# Altium footprint library mainLib.PcbLib: 169 footprints (part 5 of 11)
Each footprint in its own frame and in the unit in brackets; x right, y up, seen from the top. Pads: shape width x height; smd on the part's side, far side on the other; paste and mask are expansions set on the pad; w line width, h text height; cw(c..) or ccw(c..) is an arc to the next point about the centre after c.
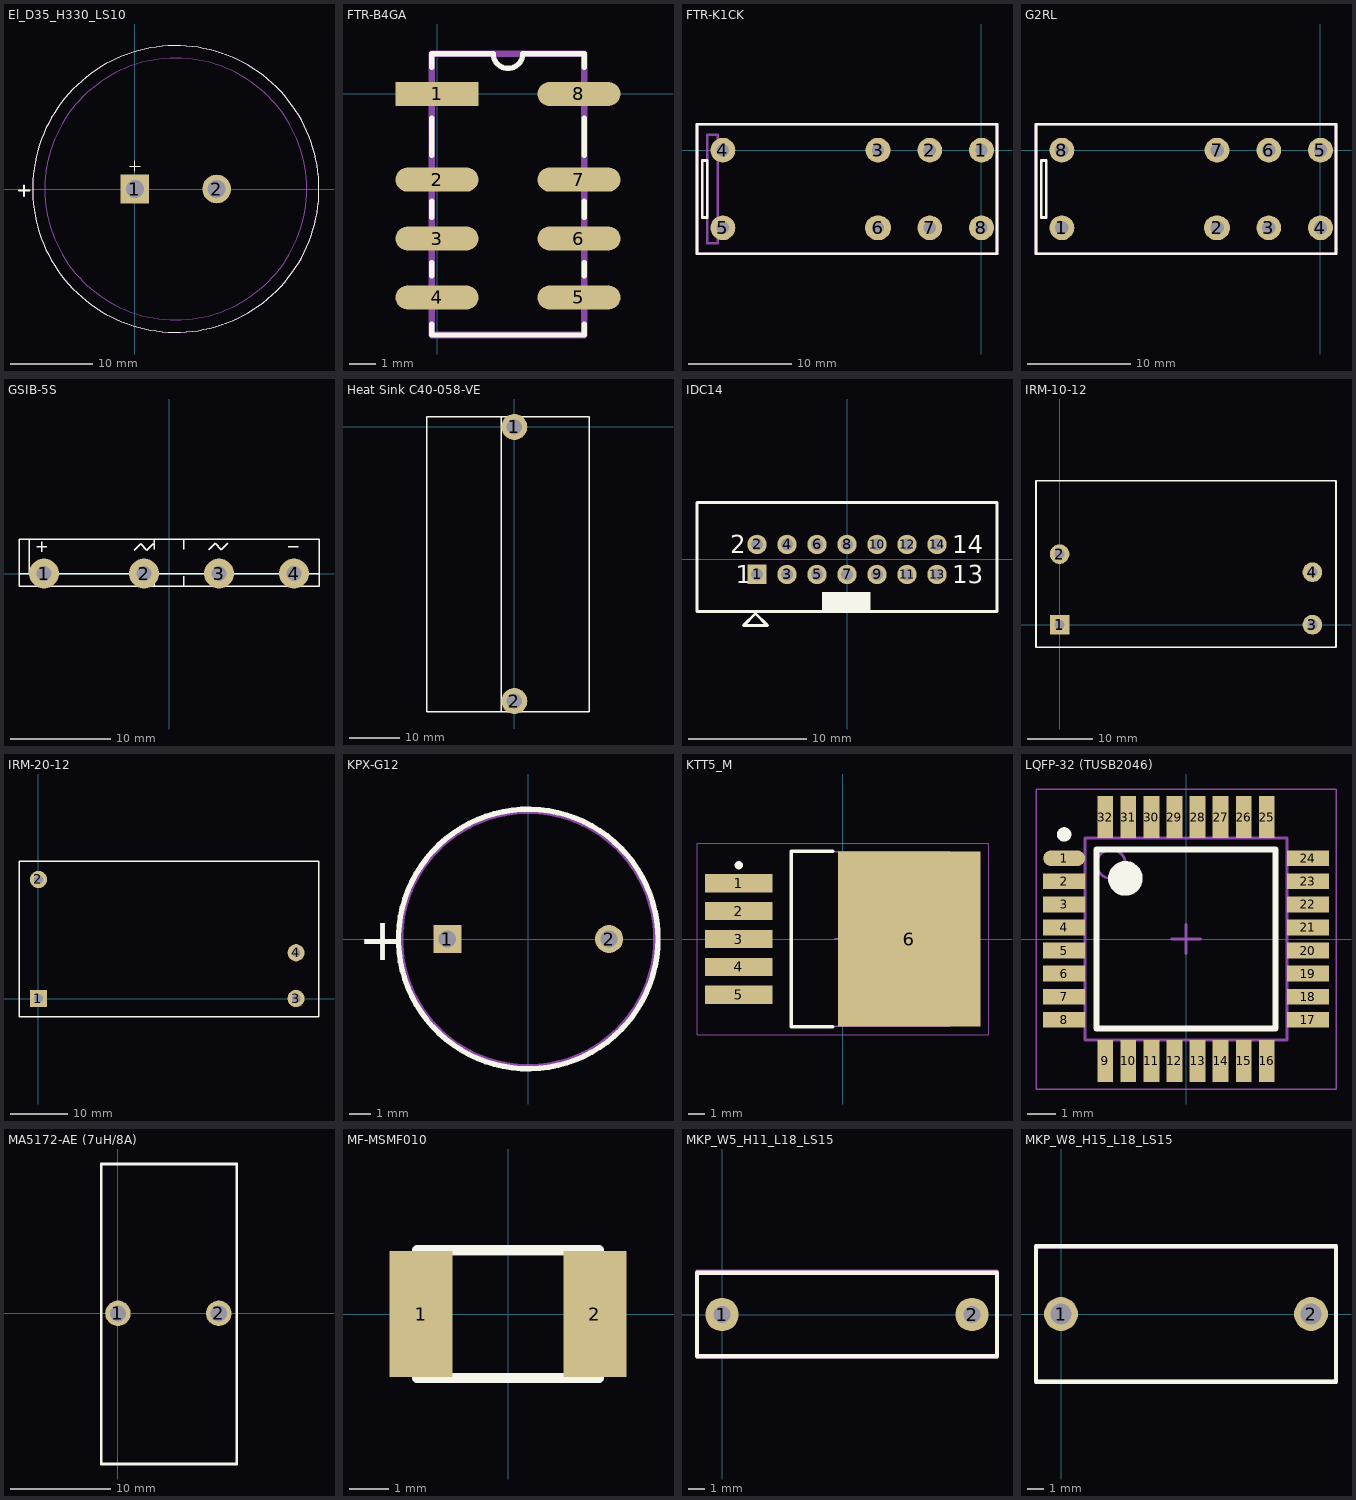
[diagram p4: the footprints below, top view; thin cyan lines are the x and y axes]

## El_D35_H330_LS10 [mm]
pads (2):
  rect 3.5x3.5 hole 2.2: 1(0,0)
  round 3.5 hole 2.2 mask+0.102: 2(10,0)
Top Overlay:
  circle w0.127: c5,0 r17.5
  lines w0.127: -0.635,2.803 0.635,2.803 ; 0,2.168 0,3.438
  lines w0.254: -14.15,-0.175 -12.9,-0.175 ; -13.525,-0.825 -13.525,0.425
Mechanical 13:
  circle w0.127: c5,0 r17.5
  circle w0.127: c5,0 r16
  circle w0.127: c5,0 r17.5
3D body: height 3, standoff 0, extent -12.499,-17.499 22.499,17.499
3D body: height 30, standoff 5, extent -12.499,-17.499 22.499,17.499
3D body: height 5, standoff 3, extent -10.999,-15.999 20.999,15.999

## FTR-B4GA [mm] "FTR-B4GA"
height 9.7
pads (8):
  rect 3.1x0.9 smd: 1(0,0)
  oval 3.1x0.9 smd: 2(0,-3.2) 3(0,-5.4) 4(0,-7.6) 5(5.3,-7.6) 6(5.3,-5.4) 7(5.3,-3.2) 8(5.3,0)
Top Overlay:
  lines w0.2: -0.2,-8.6 -0.2,-9 5.5,-9 5.5,-8.6 ; -0.2,-6.8 -0.2,-6.3 ; -0.2,-4.6 -0.2,-4 ; -0.2,-2.3 -0.2,-0.9 ; -0.2,1 -0.2,1.5 2.1,1.5 ccw(c2.65,1.5) 3.2,1.5 5.5,1.5 5.5,1 ; 5.5,-6.8 5.5,-6.3 ; 5.5,-4.6 5.5,-4 ; 5.5,-2.3 5.5,-0.9
Mechanical 13:
  lines w0.254: -0.2,-9 -0.2,1.5 5.5,1.5 5.5,-9 -0.2,-9
3D body: height 9.7, standoff 0, extent -0.199,-8.999 5.499,1.499

## FTR-K1CK [mm]
pads (8):
  round 2.4 hole 1.2: 1(0,0) 2(-5,0) 3(-10,0) 4(-25,0) 5(-25,-7.5) 7(-5,-7.5) 8(0,-7.5)
  oval 2.5x2.4 hole 1.2: 6(-10,-7.5)
Top Overlay:
  lines w0.254: -27.5,-10 1.5,-10 1.5,2.5 -27.5,2.5 -27.5,-10 ; -27,-6.5 -27,-1 -26.5,-1 -26.5,-6.5 -27,-6.5
Mechanical 13:
  lines w0.254: -27.5,-10 1.5,-10 1.5,2.5 -27.5,2.5 -27.5,-10 ; -26.5,-9 -25.5,-9 -25.5,1.5 -26.5,1.5 -26.5,-9
3D body: height 15.6, standoff 0, extent -27.499,-9.999 1.499,2.499
3D body: height 15.7, standoff 15.6, extent -26.499,-8.999 -25.501,1.499

## G2RL [mm]
pads (8):
  round 2.4 hole 1.3: 1(-25,-7.5) 3(-5,-7.5) 4(0,-7.5) 5(0,0) 6(-5,0) 7(-10,0) 8(-25,0)
  oval 2.5x2.4 hole 1.3: 2(-10,-7.5)
Top Overlay:
  lines w0.254: -27.5,-10 -27.5,2.5 1.5,2.5 1.5,-10 -27.5,-10 ; -27,-6.5 -26.5,-6.5 -26.5,-1 -27,-1 -27,-6.5
Mechanical 13:
  lines w0.254: -27.5,-10 -27.5,2.5 1.5,2.5 1.5,-10 -27.5,-10
3D body: height 15.7, standoff 15.6, extent -26.499,-8.999 -25.501,1.499
3D body: height 15.6, standoff 0, extent -27.499,-9.999 1.499,2.499

## GSIB-5S [mm]
pads (4):
  round 3 hole 1.5: 1(-12.5,0) 2(-2.5,0) 3(5,0) 4(12.5,0)
Top Overlay:
  lines w0.127: -15,0 15,0 ; -14,0 -14,3.4 ; -13.2,2.667 -12.2,2.667 ; -12.7,2.167 -12.7,3.167 ; -3.484,2.341 -2.849,2.976 -2.214,2.341 -1.579,2.976 ; -1.5,-1.27 -1.5,-0.27 ; -1.5,2.4 -1.5,3.4 ; 1.5,-1.27 1.5,-0.27 ; 1.5,2.4 1.5,3.4 ; 3.969,2.388 4.604,3.023 5.239,2.388 5.874,3.023 ; 11.946,2.667 12.946,2.667 ; -15,-1.27 15,-1.27 15,3.4 -15,3.4 -15,-1.27
3D body "Bridge-GBJ2506.STEP": height 28, standoff -2, extent -15,-1.2 15,3.4

## Heat Sink C40-058-VE [mm]
pads (2):
  round 5.1 hole 3: 1(0,0) 2(0,-53.925)
Top Overlay:
  lines w0.254: -2.6,-56 14.75,-56 14.75,2 -2.625,2 ; -2.625,2 -2.625,-56 -17.25,-56 -17.25,2 -2.625,2
3D body "User Library-heatsink_sp-1.STEP": height 46.4, standoff -3.9, extent -17.25,-56 14.75,2

## IDC14 [mm]
height 25.75
pads (14):
  rect 1.65x1.65 hole 1: 1(-7.62,-1.27)
  round 1.65 hole 1: 2(-7.62,1.27) 3(-5.08,-1.27) 4(-5.08,1.27) 5(-2.54,-1.27) 6(-2.54,1.27) 7(0,-1.27) 8(0,1.27) 9(2.54,-1.27) 10(2.54,1.27) 11(5.08,-1.27) 12(5.08,1.27) 13(7.62,-1.27) 14(7.62,1.27)
Top Overlay:
  rectangle: -2.1,-4.3 2,-2.75
  lines w0.254: -12.7,-4.4 -12.7,4.8 12.7,4.8 12.7,-4.4 -12.7,-4.4 ; -8.75,-5.575 -7.75,-4.575 -6.75,-5.575 -8.75,-5.575
  text "2" at -9.9,0.52 h1.5
  text "1" at -9.4,-2.02 h1.5
  text "14" at 8.9,0.52 h1.5
  text "13" at 8.9,-2.02 h1.5
3D body "091X514X324_100081395MOD000B.STP": height 8.91, standoff -3.44, extent -12.7,-4.45 12.7,4.75

## IRM-10-12 [mm]
pads (4):
  rect 3x3 hole 1.5: 1(0,0)
  round 3 hole 1.5: 2(0,10.75) 3(38.5,0) 4(38.5,8)
Top Overlay:
  lines w0.254: -3.6,-3.45 42.1,-3.45 42.1,21.95 -3.6,21.95 -3.6,-3.45
3D body "User Library-IRM-10-12.STEP": height 22.05, standoff -3.5, extent -3.63,-3.445 42.069,21.955

## IRM-20-12 [mm]
pads (4):
  rect 3x3 hole 1.5: 1(0,0)
  round 3 hole 1.5: 2(0,20.8) 3(45,0) 4(45,8)
Top Overlay:
  lines w0.254: -3.4,-3.2 -3.4,24 49,24 49,-3.2 -3.4,-3.2
3D body "User Library-IRM-20.STEP": height 24, standoff -3.5, extent -3.402,-3.199 48.998,24.001

## KPX-G12 [mil]
height 295.28
pads (2):
  rect 52x52 hole 32: 1(-149.61,0)
  round 52 hole 32: 2(149.61,0)
Top Overlay:
  circle w10: c0,0 r240.16
  text "+" at -314.96,-39.37 h78.74
Mechanical 13:
  circle w10: c0,0 r236.22
3D body: height 295.28, standoff 0, extent -236.2,-236.2 236.2,236.2

## KTT5_M [mm] "D2-PAK, 6-Leads, Body 8.9x10.2mm, Pitch 1.7mm, Lead Span 15.2mm, IPC Low Density"
height 4.83
pads (6):
  rect 4.1x1.1 smd: 1(-6.35,3.4) 2(-6.35,1.7) 3(-6.35,0) 4(-6.35,-1.7) 5(-6.35,-3.4)
  rect 8.7x10.7 smd: 6(4.05,0)
Top Overlay:
  circle w0.25: c-6.35,4.5 r0.125
  lines w0.2: -0.6,-5.35 -3.15,-5.35 -3.15,5.35 -0.6,5.35
Mechanical 13:
  lines w0.1: -3.15,-5.325 -3.15,5.325 6.5,5.325 6.5,-5.325 -3.15,-5.325
Mechanical 15:
  lines w0.05: -8.9,-5.85 -8.9,5.85 8.9,5.85 8.9,-5.85 -8.9,-5.85
  lines w0.1: -0.5,0 0.5,0 ; 0,-0.5 0,0.5
3D body: height 4.83, standoff 0, extent -3.15,-5.325 6.5,5.325

## LQFP-32 (TUSB2046) [mm] "TQFP, 32-Leads, Body 7,00x7,00mm, Pitch 0,80mm, IPC Low Density"
height 1.6
pads (32):
  oval 1.45x0.55 smd: 1(-4.225,2.8)
  rect 1.45x0.55 smd: 2(-4.225,2) 3(-4.225,1.2) 4(-4.225,0.4) 5(-4.225,-0.4) 6(-4.225,-1.2) 7(-4.225,-2) 8(-4.225,-2.8) 17(4.225,-2.8) 18(4.225,-2) 19(4.225,-1.2) 20(4.225,-0.4) 21(4.225,0.4) 22(4.225,1.2) 23(4.225,2) 24(4.225,2.8)
  rect 0.55x1.45 smd: 9(-2.8,-4.225) 10(-2,-4.225) 11(-1.2,-4.225) 12(-0.4,-4.225) 13(0.4,-4.225) 14(1.2,-4.225) 15(2,-4.225) 16(2.8,-4.225) 25(2.8,4.225) 26(2,4.225) 27(1.2,4.225) 28(0.4,4.225) 29(-0.4,4.225) 30(-1.2,4.225) 31(-2,4.225) 32(-2.8,4.225)
Top Overlay:
  circle w0.6: c-2.1,2.1 r0.3
  circle w0.25: c-4.225,3.625 r0.125
  lines w0.2: -3.1,-3.1 3.1,-3.1 3.1,3.1 -3.1,3.1 -3.1,-3.1
Mechanical 13:
  circle w0.1: c-2.6,2.6 r0.5
  lines w0.1: -3.5,-3.5 3.5,-3.5 3.5,3.5 -3.5,3.5 -3.5,-3.5
Mechanical 15:
  lines w0.05: -5.2,-5.2 5.2,-5.2 5.2,5.2 -5.2,5.2 -5.2,-5.2
  lines w0.1: -0.5,0 0.5,0 ; 0,-0.5 0,0.5
3D body "LQFP-32 (TUSB2046).step": height 1.6, standoff 0, extent -4.5,-4.5 4.5,4.5

## MA5172-AE (7uH/8A) [mil]
pads (2):
  round 100 hole 63: 1(0,0) 2(395,0)
Top Overlay:
  lines w10: -65,-590 465,-590 465,-575 465,585 455,585 -65,585 -65,550 -65,-585 -65,-590
3D body: height 1120, standoff 0, extent -25,-564.85 430,554.85
3D body: height 484.25, standoff 0, extent -104.98,-314.98 524.98,314.98

## MF-MSMF010 [mm]
pads (2):
  rect 1.6x3.2 smd: 1(-2.2,0) 2(2.2,0)
Top Overlay:
  lines w0.254: -2.3,-1.62 2.3,-1.62 2.3,1.62 -2.3,1.62 -2.3,-1.62
Mechanical 13:
  lines w0.254: -2.3,-1.625 2.3,-1.625 2.3,1.625 2.275,1.6 -2.3,1.6 -2.3,-1.625
3D body: height 1.1, standoff 0, extent -2.427,-1.752 2.427,1.752

## MKP_W5_H11_L18_LS15 [mm]
pads (2):
  round 2 hole 1: 1(0,0) 2(14.986,0)
Top Overlay:
  lines w0.254: -1.499,-2.5 16.485,-2.5 16.485,2.5 11.989,2.5 2.997,2.5 -1.499,2.5 -1.499,0 -1.499,-2.5
Mechanical 13:
  lines w0.254: -1.499,2.5 -1.499,0 -1.499,-2.5 16.485,-2.5 16.485,2.5 ; -1.499,2.564 2.997,2.564 11.989,2.564 16.485,2.564
3D body: height 11, standoff 0, extent -1.626,-2.627 16.612,2.691

## MKP_W8_H15_L18_LS15 [mil]
pads (2):
  round 80 hole 50: 1(0,0) 2(590,0)
Top Overlay:
  lines w10: -59,-160 -59,0 -59,160 649,160 649,-160 -59,-160
Mechanical 13:
  lines w10: -59,-160 -59,0 -59,160 649,160 649,-160 -59,-160
3D body: height 590, standoff 0, extent -64,-165 654,165